# Altium footprint library Integrados.PcbLib: 96 footprints (part 2 of 6)
Each footprint in its own frame and in the unit in brackets; x right, y up, seen from the top. Pads: shape width x height; smd on the part's side, far side on the other; paste and mask are expansions set on the pad; w line width, h text height; cw(c..) or ccw(c..) is an arc to the next point about the centre after c.
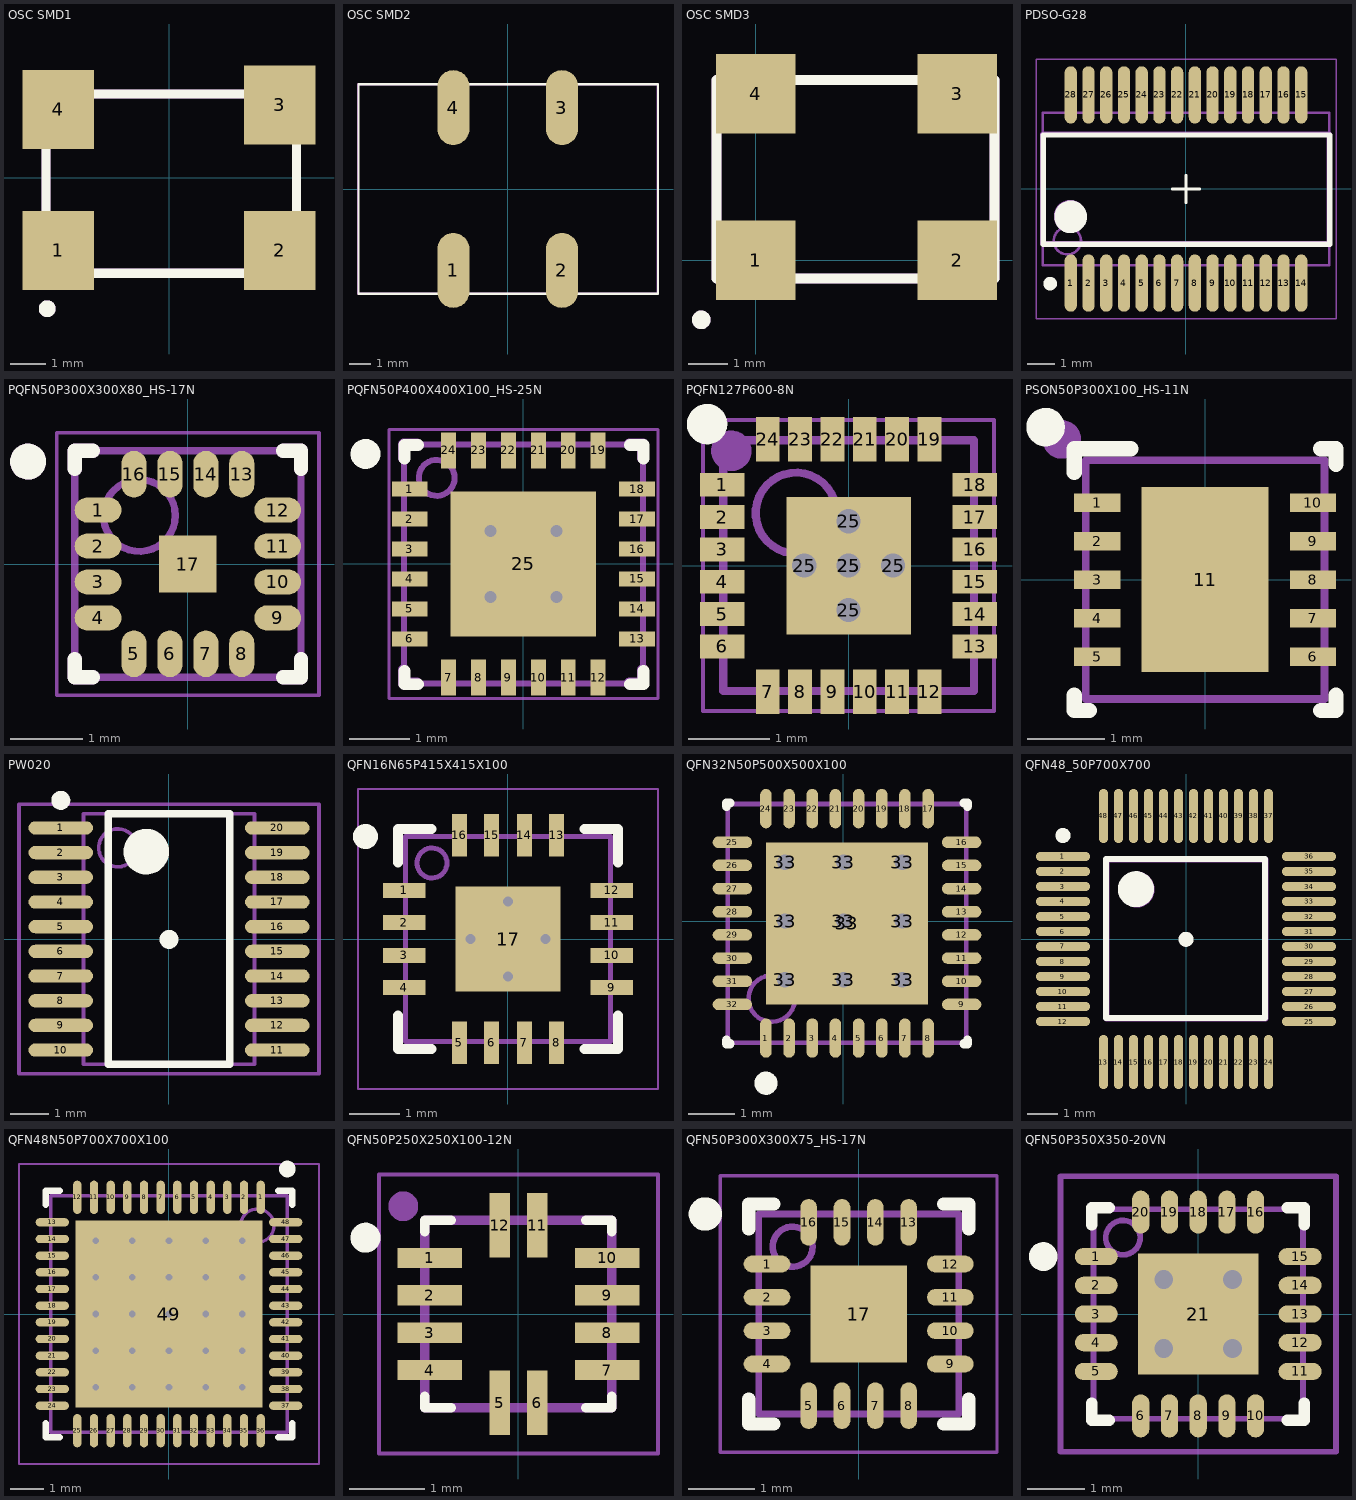
[diagram p1: the footprints below, top view; thin cyan lines are the x and y axes]

## OSC SMD1 [mm] "Oscilador"
pads (4):
  rect 2x2.2 smd: 1(-3.086,-2.032) 2(3.086,-2.032) 3(3.086,2.032) 4(-3.086,1.905)
Top Overlay:
  circle w0.254: c-3.397,-3.658 r0.108
  lines w0.254: -3.437,-2.667 -3.437,2.333 3.564,2.333 3.564,-2.667 -3.437,-2.667
Mechanical 29:
  circle w0.254: c-3.397,-3.658 r0.108
  lines w0.254: -3.437,-2.667 3.564,-2.667 3.564,2.333 -3.437,2.333 -3.437,-2.667
  text "'.Designator'" at -2.992,-0.319 h0.5
3D body "OSC.step": height 1.6, standoff 0, extent -3.437,-2.667 3.564,2.333

## OSC SMD2 [mm] "ECS-8FX SERIES"
pads (4):
  oval 1.5x3.5 smd: 1(-2.54,-3.81) 2(2.54,-3.81) 3(2.54,3.81) 4(-2.54,3.81)
Top Overlay:
  lines w0.1: -6.98,4.9 -6.98,-4.9 7.03,-4.9 7.03,4.9 -6.965,4.9
Mechanical 29:
  lines w0.1: -7,4.9 -7,-4.9 7.01,-4.9 7.01,4.9 -6.985,4.9
  text "'.Designator'" at -2.852,-0.119 h0.5
3D body "ECS-8FX.STEP": height 4.36, standoff 0.05, extent -7.025,-5.01 6.975,5.055

## OSC SMD3 [mm] "FXO-HC736R-50 (7 x 5 mm)"
pads (4):
  rect 2x2 smd: 1(0,0) 2(5.08,0) 3(5.08,4.2) 4(0,4.2)
Top Overlay:
  circle w0.254: c-1.372,-1.499 r0.108
  lines w0.254: -0.985,-0.457 6.015,-0.457 6.015,4.543 -0.985,4.543 -0.985,-0.457
Mechanical 29:
  circle w0.254: c-1.372,-1.499 r0.108
  lines w0.254: -0.985,-0.457 -0.985,4.543 6.015,4.543 6.015,-0.457 -0.985,-0.457
  text "'.Designator'" at -0.542,1.841 h0.5
3D body "OSC.step": height 1.6, standoff 0, extent -0.985,-0.29 6.015,4.71

## PDSO-G28 [mm] "SOP, 28-Leads, Body 10.2x5.3mm, Pitch 0.65mm, IPC Medium Density"
pads (28):
  oval 0.45x2.1 smd: 1(-4.223,-3.465) 2(-3.573,-3.465) 3(-2.923,-3.465) 4(-2.273,-3.465) 5(-1.623,-3.465) 6(-0.973,-3.465) 7(-0.323,-3.465) 8(0.327,-3.465) 9(0.977,-3.465) 10(1.627,-3.465) 11(2.277,-3.465) 12(2.927,-3.465) 13(3.577,-3.465) 14(4.227,-3.465) 15(4.227,3.435) 16(3.577,3.435) 17(2.927,3.435) 18(2.277,3.435) 19(1.627,3.435) 20(0.977,3.435) 21(0.327,3.435) 22(-0.323,3.435) 23(-0.973,3.435) 24(-1.623,3.435) 25(-2.273,3.435) 26(-2.923,3.435) 27(-3.573,3.435) 28(-4.223,3.435)
Top Overlay:
  circle w0.6: c-4.228,-1.035 r0.3
  circle w0.25: c-4.978,-3.485 r0.125
  lines w0.1: -0.498,-0.015 0.502,-0.015 ; 0.002,-0.515 0.002,0.485
  lines w0.2: -5.228,-2.035 -5.228,1.965 5.272,1.965 5.272,-2.035 -5.228,-2.035
Mechanical 13:
  circle w0.1: c-4.348,-1.915 r0.5
  lines w0.1: -5.248,-2.815 5.252,-2.815 5.252,2.785 -5.248,2.785 -5.248,-2.815
Mechanical 15:
  lines w0.05: -5.498,-4.765 5.502,-4.765 5.502,4.735 -5.498,4.735 -5.498,-4.765
Mechanical 29:
  circle w0.6: c-4.248,-1.015 r0.3
  lines w0.2: -5.248,-2.015 5.252,-2.015 5.252,1.985 -5.248,1.985 -5.248,-2.015
  text "'.Designator'" at -0.372,-0.059 h0.5
3D body "PWP (R-PDSO-G28).STEP": height 1.2, standoff 0, extent -4.898,-3.336 4.902,3.285

## PQFN50P300X300X80_HS-17N [mm] "PQFN, 16-Leads, Body 3.00x3.00mm, Pitch 0.50mm, Thermal Pad 0.80x0.80mm, IPC Medium Density"
height 0.8
pads (17):
  oval 0.65x0.35 smd: 1(-1.25,0.75) 2(-1.25,0.25) 3(-1.25,-0.25) 4(-1.25,-0.75) 9(1.25,-0.75) 10(1.25,-0.25) 11(1.25,0.25) 12(1.25,0.75)
  oval 0.35x0.65 smd: 5(-0.75,-1.25) 6(-0.25,-1.25) 7(0.25,-1.25) 8(0.75,-1.25) 13(0.75,1.25) 14(0.25,1.25) 15(-0.25,1.25) 16(-0.75,1.25)
  rect 0.8x0.8 smd: 17(0,0)
Top Overlay:
  circle w0.25: c0,-0.01 r0.125
  circle w0.25: c-2.225,1.425 r0.125
  lines w0.2: -1.575,-1.325 -1.575,-1.575 -1.325,-1.575 ; -1.575,1.325 -1.575,1.575 -1.325,1.575 ; 1.325,-1.575 1.575,-1.575 1.575,-1.325 ; 1.325,1.575 1.575,1.575 1.575,1.325
Mechanical 13:
  circle w0.1: c-0.675,0.675 r0.5
  lines w0.1: -1.575,-1.575 -1.575,1.575 1.575,1.575 1.575,-1.575 -1.575,-1.575
Mechanical 29:
  circle w0.25: c-2.225,1.425 r0.125
  lines w0.05: -1.825,-1.825 -1.825,1.825 1.825,1.825 1.825,-1.825 -1.825,-1.825
  lines w0.2: -1.575,-1.325 -1.575,-1.575 -1.325,-1.575 ; -1.575,1.325 -1.575,1.575 -1.325,1.575 ; 1.325,-1.575 1.575,-1.575 1.575,-1.325 ; 1.325,1.575 1.575,1.575 1.575,1.325
  text "'.Designator'" at -0.382,-0.039 h0.5
3D body "PQFN50P300X300X80_HS-17N.step": height 0.8, standoff 0, extent -1.575,-1.575 1.575,1.575

## PQFN50P400X400X100_HS-25N [mm] "PQFN, 24-Leads, Body 4.00x4.00mm, Pitch 0.50mm, Thermal Pad 2.43x2.43mm, IPC Medium Density"
height 1
pads (25):
  rect 0.6x0.25 smd: 1(-1.9,1.25) 2(-1.9,0.75) 3(-1.9,0.25) 4(-1.9,-0.25) 5(-1.9,-0.75) 6(-1.9,-1.25) 13(1.9,-1.25) 14(1.9,-0.75) 15(1.9,-0.25) 16(1.9,0.25) 17(1.9,0.75) 18(1.9,1.25)
  rect 0.25x0.6 smd: 7(-1.25,-1.9) 8(-0.75,-1.9) 9(-0.25,-1.9) 10(0.25,-1.9) 11(0.75,-1.9) 12(1.25,-1.9) 19(1.25,1.9) 20(0.75,1.9) 21(0.25,1.9) 22(-0.25,1.9) 23(-0.75,1.9) 24(-1.25,1.9)
  rect 2.43x2.43 smd: 25(0,0)
via 0.55,-0.55 diameter 0.5 hole 0.2
via -0.55,-0.55 diameter 0.5 hole 0.2
via 0.55,0.55 diameter 0.5 hole 0.2
via -0.55,0.55 diameter 0.5 hole 0.2
Top Overlay:
  circle w0.25: c-2.64,1.84 r0.125
  circle w0.25: c0,-0.01 r0.125
  lines w0.2: -1.99,-1.785 -1.99,-2.01 -1.765,-2.01 ; -1.99,1.765 -1.99,1.99 -1.765,1.99 ; 1.785,-2.01 2.01,-2.01 2.01,-1.785 ; 1.785,1.99 2.01,1.99 2.01,1.765
Mechanical 15:
  lines w0.05: -2.25,-2.25 2.25,-2.25 2.25,2.25 -2.25,2.25 -2.25,-2.25
  lines w0.1: -0.5,0 0.5,0 ; 0,-0.5 0,0.5
Mechanical 29:
  circle w0.1: c-1.45,1.44 r0.3
  lines w0.1: -2,-2 2,-2 2,2 -2,2 -2,-2
  lines w0.2: -2,-1.775 -2,-2 -1.775,-2 ; -2,1.775 -2,2 -1.775,2 ; 1.775,-2 2,-2 2,-1.775 ; 1.775,2 2,2 2,1.775
  text "'.Designator'" at -1.162,-0.219 h0.5
3D body "PQFN50P400X400X100_HS-25N.step": height 1, standoff 0, extent -2,-2 2,2

## PQFN127P600-8N [mm]
height 1
pads (30):
  rect 0.55x0.295 smd: 1(-1.56,1) 2(-1.56,0.6) 3(-1.56,0.2) 4(-1.56,-0.2) 5(-1.56,-0.6) 6(-1.56,-1) 13(1.56,-1) 14(1.56,-0.6) 15(1.56,-0.2) 16(1.56,0.2) 17(1.56,0.6) 18(1.56,1)
  rect 0.295x0.55 smd: 7(-1,-1.56) 8(-0.6,-1.56) 9(-0.2,-1.56) 10(0.2,-1.56) 11(0.6,-1.56) 12(1,-1.56) 19(1,1.56) 20(0.6,1.56) 21(0.2,1.56) 22(-0.2,1.56) 23(-0.6,1.56) 24(-1,1.56)
  round 0.4 hole 0.3: 25(-0.55,0) 25(0,-0.55) 25(0,0) 25(0,0.55) 25(0.55,0)
  rect 1.54x1.7 smd: 25(0,0)
Top Overlay:
  circle w0.25: c-1.75,1.75 r0.125
Mechanical 13:
  circle w0.1: c-0.65,0.65 r0.5
  lines w0.1: -1.55,-1.55 -1.55,1.55 1.55,1.55 1.55,-1.55 -1.55,-1.55
Mechanical 15:
  lines w0.05: -1.8,-1.8 1.8,-1.8 1.8,1.8 -1.8,1.8 -1.8,-1.8
  lines w0.1: -0.5,0 0.5,0 ; 0,-0.5 0,0.5
Mechanical 29:
  circle w0.25: c-1.45,1.42 r0.125
  lines w0.05: -1.8,-1.8 -1.8,1.8 1.8,1.8 1.8,-1.8 -1.8,-1.8
  lines w0.1: -0.5,0 0.5,0 ; 0,-0.5 0,0.5
  text "'.Designator'" at -0.742,-0.229 h0.5
3D body "PQFN127P600-8N.step": height 0.9, standoff -0.1, extent -1.55,-1.55 1.55,1.55

## PSON50P300X100_HS-11N [mm] "PSON, 10-Leads, Body 3.00x3.00mm, Pitch 0.50mm, Thermal Pad 2.40x1.28mm, IPC Medium Density"
height 1
pads (11):
  rect 0.6x0.24 smd paste+0 mask+0.051: 1(-1.4,1) 2(-1.4,0.5) 3(-1.4,0) 4(-1.4,-0.5) 5(-1.4,-1) 6(1.4,-1) 7(1.4,-0.5) 8(1.4,0) 9(1.4,0.5) 10(1.4,1)
  rect 1.65x2.4 smd paste-1.187 mask+0.051: 11(0,0)
Top Overlay:
  circle w0.25: c0,-0.01 r0.125
  circle w0.25: c-2.07,1.98 r0.125
  lines w0.2: -1.7,-1.5 -1.7,-1.7 -1.5,-1.7 ; -1.7,1.39 -1.7,1.7 -0.965,1.7 ; 1.5,-1.7 1.7,-1.7 1.7,-1.5 ; 1.5,1.7 1.7,1.7 1.7,1.5
Top Paste:
  region: -0.75,1.165 -0.75,0.1 0.75,0.1 0.75,1.165
  region: -0.75,-0.1 -0.75,-1.165 0.75,-1.165 0.75,-0.1
Mechanical 29:
  circle w0.25: c-1.86,1.82 r0.125
  lines w0.1: -1.55,-1.55 -1.55,1.55 1.55,1.55 1.55,-1.55 -1.55,-1.55
  text "'.Designator'" at 0.209,-1.402 h0.5
3D body "PSON50P300X100_HS-11N.step": height 1, standoff 0, extent -1.551,-1.55 1.551,1.55

## PW020 [mm]
pads (20):
  oval 1.7x0.35 smd: 1(-2.85,2.925) 2(-2.85,2.275) 3(-2.85,1.625) 4(-2.85,0.975) 5(-2.85,0.325) 6(-2.85,-0.325) 7(-2.85,-0.975) 8(-2.85,-1.625) 9(-2.85,-2.275) 10(-2.85,-2.925) 11(2.85,-2.925) 12(2.85,-2.275) 13(2.85,-1.625) 14(2.85,-0.975) 15(2.85,-0.325) 16(2.85,0.325) 17(2.85,0.975) 18(2.85,1.625) 19(2.85,2.275) 20(2.85,2.925)
Top Overlay:
  circle w0.25: c0,-0.01 r0.125
  circle w0.6: c-0.6,2.3 r0.3
  circle w0.25: c-2.85,3.65 r0.125
  lines w0.2: -1.6,-3.3 1.6,-3.3 1.6,3.3 -1.6,3.3 -1.6,-3.3
Mechanical 15:
  lines w0.1: -3.95,-3.55 3.95,-3.55 3.95,3.55 -3.95,3.55 -3.95,-3.55
Mechanical 29:
  circle w0.1: c-1.35,2.4 r0.5
  lines w0.1: -2.25,-3.3 2.25,-3.3 2.25,3.3 -2.25,3.3 -2.25,-3.3
  text "'.Designator'" at 0.169,-3.102 h0.5
3D body "TSSOP20.step": height 1.09, standoff 0, extent -3.14,-3.35 3.14,3.15

## QFN16N65P415X415X100 [mm]
pads (17):
  rect 0.85x0.3 smd: 1(-2.075,0.975) 2(-2.075,0.325) 3(-2.075,-0.325) 4(-2.075,-0.975) 9(2.075,-0.975) 10(2.075,-0.325) 11(2.075,0.325) 12(2.075,0.975)
  rect 0.3x0.85 smd: 5(-0.975,-2.075) 6(-0.325,-2.075) 7(0.325,-2.075) 8(0.975,-2.075) 13(0.975,2.075) 14(0.325,2.075) 15(-0.325,2.075) 16(-0.975,2.075)
  rect 2.1x2.1 smd paste-1.05: 17(0,0)
via 0.75,0 diameter 0.5 hole 0.2
via -0.75,0 diameter 0.5 hole 0.2
via 0,0.75 diameter 0.5 hole 0.2
via 0,-0.75 diameter 0.5 hole 0.2
Top Overlay:
  circle w0.25: c-2.85,2.05 r0.125
  circle w0.25: c0,-0.01 r0.125
  lines w0.2: -2.2,-1.525 -2.2,-2.2 -1.525,-2.2 ; -2.2,1.525 -2.2,2.2 -1.525,2.2 ; 1.525,-2.2 2.2,-2.2 2.2,-1.525 ; 1.525,2.2 2.2,2.2 2.2,1.525
Top Paste:
  rectangle: -0.95,-0.95 0.95,0.95
Mechanical 15:
  lines w0.05: -3,-3 3,-3 3,3 -3,3 -3,-3
  lines w0.1: -0.5,0 0.5,0 ; 0,-0.5 0,0.5
Mechanical 29:
  circle w0.1: c-1.52,1.52 r0.3
  lines w0.1: -2.05,-2.05 2.05,-2.05 2.05,2.05 -2.05,2.05 -2.05,-2.05
  text "'.Designator'" at -1.862,-0.189 h0.5
3D body "QFN-16-1.step": height 0.85, standoff 0, extent -2.085,-2.085 2.085,2.085

## QFN32N50P500X500X100 [mm] "QFN, 32-Leads, Body 5,2x5,2mm (max), Pitch 0,50mm, IPC Medium Density"
height 1
pads (42):
  oval 0.25x0.85 smd: 1(-1.674,-2.526) 2(-1.174,-2.526) 3(-0.674,-2.526) 4(-0.174,-2.526) 5(0.326,-2.526) 6(0.826,-2.526) 7(1.326,-2.526) 8(1.826,-2.526) 17(1.826,2.424) 18(1.326,2.424) 19(0.826,2.424) 20(0.326,2.424) 21(-0.174,2.424) 22(-0.674,2.424) 23(-1.174,2.424) 24(-1.674,2.424)
  oval 0.85x0.25 smd: 9(2.551,-1.801) 10(2.551,-1.301) 11(2.551,-0.801) 12(2.551,-0.301) 13(2.551,0.199) 14(2.551,0.699) 15(2.551,1.199) 16(2.551,1.699) 25(-2.399,1.699) 26(-2.399,1.199) 27(-2.399,0.699) 28(-2.399,0.199) 29(-2.399,-0.301) 30(-2.399,-0.801) 31(-2.399,-1.301) 32(-2.399,-1.801)
  round 0.66 hole 0.33: 33(-1.27,-1.27) 33(-1.27,0) 33(-1.27,1.27) 33(0,-1.27) 33(0,0) 33(0,1.27) 33(1.27,-1.27) 33(1.27,0) 33(1.27,1.27)
  rect 3.5x3.5 smd: 33(0.076,-0.051)
Top Overlay:
  circle w0.25: c0,-0.01 r0.125
  circle w0.25: c-1.674,-3.501 r0.125
  lines w0.2: -2.524,-2.576 -2.524,-2.651 -2.449,-2.651 ; -2.524,2.474 -2.524,2.549 -2.449,2.549 ; 2.601,-2.651 2.676,-2.651 2.676,-2.576 ; 2.601,2.549 2.676,2.549 2.676,2.474
Mechanical 15:
  lines w0.1: -0.424,-0.051 0.576,-0.051 ; 0.076,-0.551 0.076,0.449
Mechanical 29:
  circle w0.1: c-1.549,-1.676 r0.5
  lines w0.1: -2.499,-2.626 -2.499,2.524 2.651,2.524 2.651,-2.626 -2.499,-2.626
  text "'.Designator'" at -1.702,-0.179 h0.5
3D body "QFN32.step": height 0.7, standoff -0.05, extent -2.424,-2.54 2.576,2.465

## QFN48_50P700X700 [mm]
pads (48):
  oval 1.8x0.3 smd: 1(-4.1,2.75) 2(-4.1,2.25) 3(-4.1,1.75) 4(-4.1,1.25) 5(-4.1,0.75) 6(-4.1,0.25) 7(-4.1,-0.25) 8(-4.1,-0.75) 9(-4.1,-1.25) 10(-4.1,-1.75) 11(-4.1,-2.25) 12(-4.1,-2.75) 25(4.1,-2.75) 26(4.1,-2.25) 27(4.1,-1.75) 28(4.1,-1.25) 29(4.1,-0.75) 30(4.1,-0.25) 31(4.1,0.25) 32(4.1,0.75) 33(4.1,1.25) 34(4.1,1.75) 35(4.1,2.25) 36(4.1,2.75)
  oval 0.3x1.8 smd: 13(-2.75,-4.1) 14(-2.25,-4.1) 15(-1.75,-4.1) 16(-1.25,-4.1) 17(-0.75,-4.1) 18(-0.25,-4.1) 19(0.25,-4.1) 20(0.75,-4.1) 21(1.25,-4.1) 22(1.75,-4.1) 23(2.25,-4.1) 24(2.75,-4.1) 37(2.75,4.1) 38(2.25,4.1) 39(1.75,4.1) 40(1.25,4.1) 41(0.75,4.1) 42(0.25,4.1) 43(-0.25,4.1) 44(-0.75,4.1) 45(-1.25,4.1) 46(-1.75,4.1) 47(-2.25,4.1) 48(-2.75,4.1)
Top Overlay:
  circle w0.25: c0,-0.01 r0.125
  circle w0.25: c-4.1,3.45 r0.125
  circle w0.6: c-1.67,1.66 r0.3
  lines w0.2: -2.67,-2.64 2.63,-2.64 2.63,2.66 -2.67,2.66 -2.67,-2.64
Mechanical 29:
  circle w0.6: c-1.65,1.65 r0.3
  lines w0.2: -2.65,-2.65 -2.65,2.65 2.65,2.65 2.65,-2.65 -2.65,-2.65
  text "'.Designator'" at -2.452,-0.159 h0.5
3D body "LQFP48-7x7-0_50.step": height 1.45, standoff 0, extent -4.5,-4.496 4.5,4.504

## QFN48N50P700X700X100 [mm] "QFN, 48-Leads, Body 7.1x7.1mm (max), Pitch 0,50mm, IPC Medium Density"
height 1
pads (49):
  oval 0.25x1 smd: 1(2.75,3.5) 2(2.25,3.5) 3(1.75,3.5) 4(1.25,3.5) 5(0.75,3.5) 6(0.25,3.5) 7(-0.25,3.5) 8(-0.75,3.5) 9(-1.25,3.5) 10(-1.75,3.5) 11(-2.25,3.5) 12(-2.75,3.5) 25(-2.75,-3.5) 26(-2.25,-3.5) 27(-1.75,-3.5) 28(-1.25,-3.5) 29(-0.75,-3.5) 30(-0.25,-3.5) 31(0.25,-3.5) 32(0.75,-3.5) 33(1.25,-3.5) 34(1.75,-3.5) 35(2.25,-3.5) 36(2.75,-3.5)
  oval 1x0.25 smd: 13(-3.5,2.75) 14(-3.5,2.25) 15(-3.5,1.75) 16(-3.5,1.25) 17(-3.5,0.75) 18(-3.5,0.25) 19(-3.5,-0.25) 20(-3.5,-0.75) 21(-3.5,-1.25) 22(-3.5,-1.75) 23(-3.5,-2.25) 24(-3.5,-2.75) 37(3.5,-2.75) 38(3.5,-2.25) 39(3.5,-1.75) 40(3.5,-1.25) 41(3.5,-0.75) 42(3.5,-0.25) 43(3.5,0.25) 44(3.5,0.75) 45(3.5,1.25) 46(3.5,1.75) 47(3.5,2.25) 48(3.5,2.75)
  rect 5.6x5.6 smd: 49(0,0)
via 2.2,2.2 diameter 0.5 hole 0.2
via 2.2,1.1 diameter 0.5 hole 0.2
via 2.2,0 diameter 0.5 hole 0.2
via 2.2,-1.1 diameter 0.5 hole 0.2
via 2.2,-2.2 diameter 0.5 hole 0.2
via 1.1,2.2 diameter 0.5 hole 0.2
via 1.1,1.1 diameter 0.5 hole 0.2
via 1.1,0 diameter 0.5 hole 0.2
via 1.1,-1.1 diameter 0.5 hole 0.2
via 1.1,-2.2 diameter 0.5 hole 0.2
via 0,2.2 diameter 0.5 hole 0.2
via 0,1.1 diameter 0.5 hole 0.2
via 0,0 diameter 0.5 hole 0.2
via 0,-1.1 diameter 0.5 hole 0.2
via 0,-2.2 diameter 0.5 hole 0.2
via -1.1,2.2 diameter 0.5 hole 0.2
via -1.1,1.1 diameter 0.5 hole 0.2
via -1.1,0 diameter 0.5 hole 0.2
via -1.1,-1.1 diameter 0.5 hole 0.2
via -1.1,-2.2 diameter 0.5 hole 0.2
via -2.2,2.2 diameter 0.5 hole 0.2
via -2.2,1.1 diameter 0.5 hole 0.2
via -2.2,0 diameter 0.5 hole 0.2
via -2.2,-1.1 diameter 0.5 hole 0.2
via -2.2,-2.2 diameter 0.5 hole 0.2
Top Overlay:
  circle w0.25: c0,-0.01 r0.125
  circle w0.25: c3.55,4.35 r0.125
  lines w0.2: -3.7,-3.275 -3.7,-3.7 -3.275,-3.7 ; -3.7,3.275 -3.7,3.7 -3.275,3.7 ; 3.275,-3.7 3.7,-3.7 3.7,-3.275 ; 3.275,3.7 3.7,3.7 3.7,3.275
Mechanical 15:
  lines w0.05: -4.5,-4.5 4.5,-4.5 4.5,4.5 -4.5,4.5 -4.5,-4.5
  lines w0.1: -0.5,0 0.5,0 ; 0,-0.5 0,0.5
Mechanical 29:
  circle w0.1: c2.65,2.65 r0.5
  lines w0.1: -3.55,-3.55 3.55,-3.55 3.55,3.55 -3.55,3.55 -3.55,-3.55
  text "'.Designator'" at -2.622,-0.169 h0.5
3D body "QFN48_7x7.step": height 0.78, standoff -0.02, extent -3.48,-3.489 3.54,3.531

## QFN50P250X250X100-12N [mm]
pads (12):
  rect 0.86x0.27 smd: 1(-1.185,0.75) 2(-1.185,0.25) 3(-1.185,-0.25) 4(-1.185,-0.75) 7(1.185,-0.75) 8(1.185,-0.25) 9(1.185,0.25) 10(1.185,0.75)
  rect 0.27x0.86 smd: 5(-0.25,-1.185) 6(0.25,-1.185) 11(0.25,1.185) 12(-0.25,1.185)
Top Overlay:
  circle w0.2: c-2.045,1.02 r0.1
  lines w0.127: -1.25,-1.1 -1.25,-1.25 -0.9,-1.25 ; -1.25,1.1 -1.25,1.25 -0.9,1.25 ; 0.9,-1.25 1.25,-1.25 1.25,-1.1 ; 0.9,1.25 1.25,1.25 1.25,1.1
Mechanical 4:
  lines w0.05: -1.865,-1.865 -1.865,1.865 1.865,1.865 1.865,-1.865 -1.865,-1.865
Mechanical 29:
  circle w0.2: c-1.54,1.44 r0.1
  lines w0.127: -1.25,-1.25 -1.25,1.25 1.25,1.25 1.25,-1.25 -1.25,-1.25
  text "'.Designator'" at -1.002,-0.209 h0.5
3D body "VQFN-12.step": height 0.97, standoff -0.03, extent -1.26,-1.26 1.26,1.26

## QFN50P300X300X75_HS-17N [mm] "QFN, 16-Leads, Body 3,00x3,00mm, Pitch 0,50mm, Thermal Pad 1,45x1,45mm, IPC Medium Density"
height 0.75
pads (17):
  oval 0.7x0.25 smd: 1(-1.375,0.75) 2(-1.375,0.25) 3(-1.375,-0.25) 4(-1.375,-0.75) 9(1.375,-0.75) 10(1.375,-0.25) 11(1.375,0.25) 12(1.375,0.75)
  oval 0.25x0.7 smd: 5(-0.75,-1.375) 6(-0.25,-1.375) 7(0.25,-1.375) 8(0.75,-1.375) 13(0.75,1.375) 14(0.25,1.375) 15(-0.25,1.375) 16(-0.75,1.375)
  rect 1.45x1.45 smd: 17(0,0)
Top Overlay:
  circle w0.25: c-2.3,1.5 r0.125
  circle w0.25: c0,-0.01 r0.125
  lines w0.2: -1.65,-1.275 -1.65,-1.65 -1.275,-1.65 ; -1.65,1.275 -1.65,1.65 -1.275,1.65 ; 1.275,-1.65 1.65,-1.65 1.65,-1.275 ; 1.275,1.65 1.65,1.65 1.65,1.275
Mechanical 15:
  lines w0.05: -2.075,-2.075 -2.075,2.075 2.075,2.075 2.075,-2.075 -2.075,-2.075
  lines w0.1: -0.5,0 0.5,0 ; 0,-0.5 0,0.5
Mechanical 29:
  circle w0.1: c-0.99,1.01 r0.3
  lines w0.1: -1.5,-1.5 -1.5,1.5 1.5,1.5 1.5,-1.5 -1.5,-1.5
  text "'.Designator'" at -1.352,-0.229 h0.5
3D body "QFN50P300X300X75_HS-17N.step": height 0.75, standoff 0, extent -1.51,-1.51 1.51,1.51

## QFN50P350X350-20VN [mm] "QFN, 20-Leads, Body 3.5x3.5mm, Pitch 0.5mm, IPC Medium Density"
height 1
pads (21):
  oval 0.75x0.3 smd: 1(-1.775,1) 2(-1.775,0.5) 3(-1.775,0) 4(-1.775,-0.5) 5(-1.775,-1) 11(1.775,-1) 12(1.775,-0.5) 13(1.775,0) 14(1.775,0.5) 15(1.775,1)
  oval 0.3x0.75 smd: 6(-1,-1.775) 7(-0.5,-1.775) 8(0,-1.775) 9(0.5,-1.775) 10(1,-1.775) 16(1,1.775) 17(0.5,1.775) 18(0,1.775) 19(-0.5,1.775) 20(-1,1.775)
  rect 2.1x2.1 smd: 21(0,0)
via 0.6,-0.6 diameter 0.66 hole 0.33
via -0.6,-0.6 diameter 0.66 hole 0.33
via 0.6,0.6 diameter 0.66 hole 0.33
via -0.6,0.6 diameter 0.66 hole 0.33
Top Overlay:
  circle w0.25: c-2.7,1 r0.125
  lines w0.1: -0.5,0 0.5,0 ; 0,-0.5 0,0.5
  lines w0.2: -1.85,-1.55 -1.85,-1.85 -1.55,-1.85 ; -1.85,1.55 -1.85,1.85 -1.55,1.85 ; 1.55,-1.85 1.85,-1.85 1.85,-1.55 ; 1.55,1.85 1.85,1.85 1.85,1.55
Mechanical 15:
  lines w0.1: -2.4,-2.4 2.4,-2.4 2.4,2.4 -2.4,2.4 -2.4,-2.4
Mechanical 29:
  circle w0.1: c-1.31,1.33 r0.3
  lines w0.1: -1.825,-1.825 1.825,-1.825 1.825,1.825 -1.825,1.825 -1.825,-1.825
  text "'.Designator'" at -1.642,-0.179 h0.5
3D body "QFN20-4x4.step": height 0.92, standoff 0, extent -2.007,-1.993 1.993,2.007